# Altium footprint library cool_library.PcbLib: 1182 footprints (part 55 of 75)
Each footprint in its own frame and in the unit in brackets; x right, y up, seen from the top. Pads: shape width x height; smd on the part's side, far side on the other; paste and mask are expansions set on the pad; w line width, h text height; cw(c..) or ccw(c..) is an arc to the next point about the centre after c.
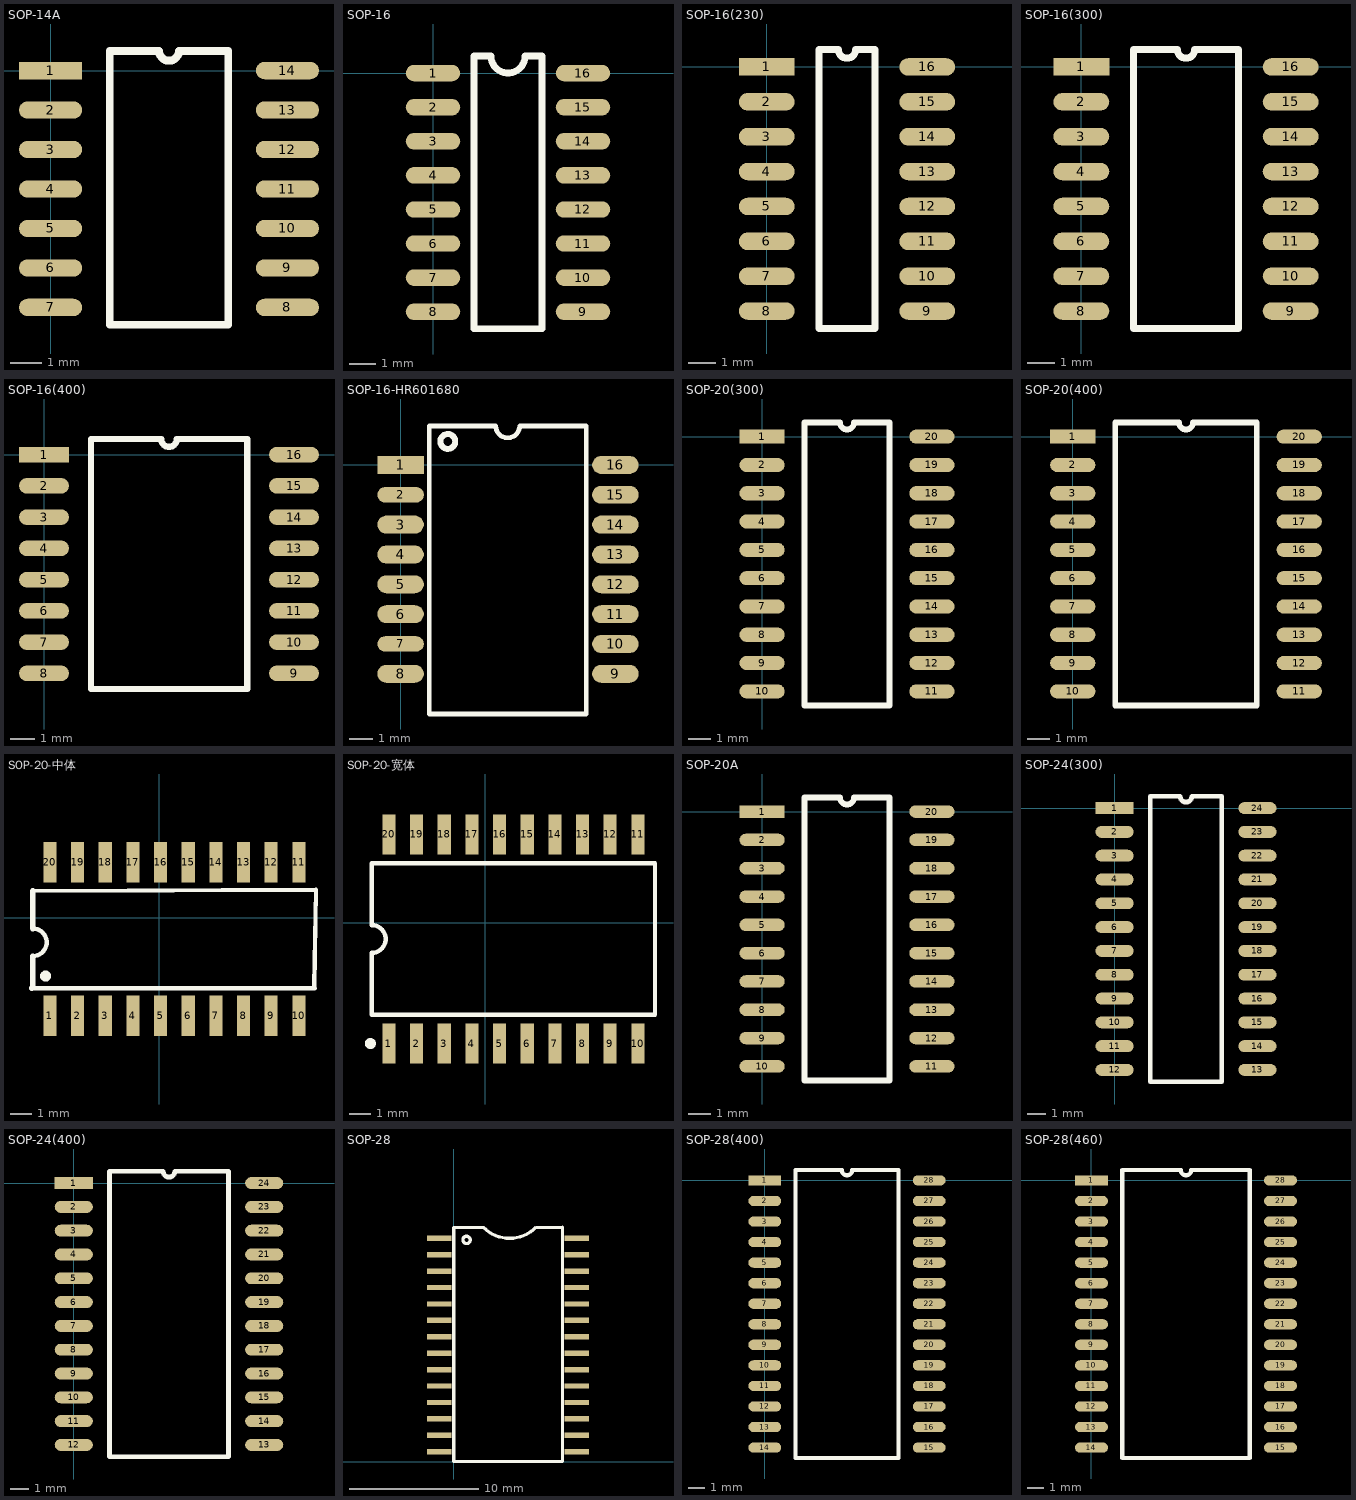
[diagram p54: the footprints below, top view; thin cyan lines are the x and y axes]

## SOP-14A [mil]
pads (14):
  rect 80x22 smd: 1(0,0)
  oval 80x22 smd: 2(0,-50) 3(0,-100) 4(0,-150) 5(0,-200) 6(0,-250) 7(0,-300) 8(300,-300) 9(300,-250) 10(300,-200) 11(300,-150) 12(300,-100) 13(300,-50) 14(300,0)
Top Overlay:
  lines w10: 75,-322 225,-322 225,25 162.5,25 cw(c150,25) 137.5,25 75,25 75,-322

## SOP-16 [mil]
height 48.03
pads (16):
  oval 80x24 smd: 1(0,0) 2(0,-50) 3(0,-100) 4(0,-150) 5(0,-200) 6(0,-250) 7(0,-300) 8(0,-350) 9(220,-350) 10(220,-300) 11(220,-250) 12(220,-200) 13(220,-150) 14(220,-100) 15(220,-50) 16(220,0)
Top Overlay:
  lines w10: 60,-375 160,-375 160,25 135,25 cw(c110,25) 85,25 60,25 60,-375
3D body: height 153.54, standoff 0, extent 44,-380 176,30

## SOP-16(230) [mil]
pads (16):
  rect 80x25 smd: 1(0,0)
  oval 80x25 smd: 2(0,-50) 3(0,-100) 4(0,-150) 5(0,-200) 6(0,-250) 7(0,-300) 8(0,-350) 9(230,-350) 10(230,-300) 11(230,-250) 12(230,-200) 13(230,-150) 14(230,-100) 15(230,-50) 16(230,0)
Top Overlay:
  lines w10: 75,-375 75,25 102.5,25 ccw(c115,25) 127.5,25 155,25 155,-375 75,-375

## SOP-16(300) [mil]
pads (16):
  rect 80x25 smd: 1(0,0)
  oval 80x25 smd: 2(0,-50) 3(0,-100) 4(0,-150) 5(0,-200) 6(0,-250) 7(0,-300) 8(0,-350) 9(300,-350) 10(300,-300) 11(300,-250) 12(300,-200) 13(300,-150) 14(300,-100) 15(300,-50) 16(300,0)
Top Overlay:
  lines w10: 75,-375 225,-375 225,25 162.5,25 cw(c150,25) 137.5,25 75,25 75,-375

## SOP-16(400) [mil]
pads (16):
  rect 80x25 smd: 1(0,0)
  oval 80x25 smd: 2(0,-50) 3(0,-100) 4(0,-150) 5(0,-200) 6(0,-250) 7(0,-300) 8(0,-350) 9(400,-350) 10(400,-300) 11(400,-250) 12(400,-200) 13(400,-150) 14(400,-100) 15(400,-50) 16(400,0)
Top Overlay:
  lines w10: 75,-375 75,25 187.5,25 ccw(c200,25) 212.5,25 325,25 325,-375 75,-375

## SOP-16-HR601680 [mil]
pads (16):
  rect 78x30 smd: 1(0,0)
  oval 78x26 smd: 2(0,-50) 7(0,-300)
  oval 78x30 smd: 3(0,-100) 4(0,-150) 5(0,-200) 6(0,-250) 8(0,-350) 9(360,-350) 10(360,-300) 11(360,-250) 12(360,-200) 13(360,-150) 14(360,-100) 15(360,-50) 16(360,0)
Top Overlay:
  circle w10: c79.1,39.37 r12.49
  lines w7.87: 48,-417.32 48,65.37 159.5,65.37 ccw(c179.5,65.37) 199.5,65.37 310.99,65.37 310.99,-417.32 48,-417.32

## SOP-20(300) [mil]
pads (20):
  rect 80x25 smd: 1(0,0)
  oval 80x25 smd: 2(0,-50) 3(0,-100) 4(0,-150) 5(0,-200) 6(0,-250) 7(0,-300) 8(0,-350) 9(0,-400) 10(0,-450) 11(300,-450) 12(300,-400) 13(300,-350) 14(300,-300) 15(300,-250) 16(300,-200) 17(300,-150) 18(300,-100) 19(300,-50) 20(300,0)
Top Overlay:
  lines w10: 75,-475 225,-475 225,25 162.5,25 cw(c150,25) 137.5,25 75,25 75,-475

## SOP-20(400) [mil]
pads (20):
  rect 80x25 smd: 1(0,0)
  oval 80x25 smd: 2(0,-50) 3(0,-100) 4(0,-150) 5(0,-200) 6(0,-250) 7(0,-300) 8(0,-350) 9(0,-400) 10(0,-450) 11(400,-450) 12(400,-400) 13(400,-350) 14(400,-300) 15(400,-250) 16(400,-200) 17(400,-150) 18(400,-100) 19(400,-50) 20(400,0)
Top Overlay:
  lines w10: 75,-475 325,-475 325,25 212.5,25 cw(c200,25) 187.5,25 75,25 75,-475

## SOP-20-中体 [mm]
pads (20):
  rect 0.6x1.85 smd: 1(-5.029,-4.495) 2(-3.759,-4.495) 3(-2.489,-4.495) 4(-1.219,-4.495) 5(0.051,-4.495) 6(1.321,-4.495) 7(2.591,-4.495) 8(3.861,-4.495) 9(5.131,-4.495) 10(6.401,-4.495) 11(6.401,2.565) 12(5.131,2.565) 13(3.861,2.565) 14(2.591,2.565) 15(1.321,2.565) 16(0.051,2.565) 17(-1.219,2.565) 18(-2.489,2.565) 19(-3.759,2.565) 20(-5.029,2.565)
Top Overlay:
  circle w0.25: c-5.23,-2.667 r0.125
  lines w0.2: -5.867,-3.226 7.133,-3.226 ; -5.817,-1.753 ccw(c-5.817,-1.118) -5.817,-0.483 ; -5.814,1.24 7.186,1.291 7.112,-3.124
  lines w0.254: -5.867,-3.226 -5.817,-3.175 -5.817,-1.753 ; -5.817,-0.483 -5.814,-0.48 -5.814,1.24

## SOP-20-宽体 [mm]
pads (20):
  rect 0.6x1.85 smd: 1(-4.42,-5.537) 2(-3.15,-5.537) 3(-1.88,-5.537) 4(-0.61,-5.537) 5(0.66,-5.537) 6(1.93,-5.537) 7(3.2,-5.537) 8(4.47,-5.537) 9(5.74,-5.537) 10(7.01,-5.537) 11(7.01,4.063) 12(5.74,4.063) 13(4.47,4.063) 14(3.2,4.063) 15(1.93,4.063) 16(0.66,4.063) 17(-0.61,4.063) 18(-1.88,4.063) 19(-3.15,4.063) 20(-4.42,4.063)
Top Overlay:
  circle w0.25: c-5.27,-5.537 r0.125
  lines w0.2: -5.205,-4.212 -5.205,-1.372 ccw(c-5.205,-0.737) -5.205,-0.102 -5.205,2.738 7.795,2.738 7.795,-4.212 -5.205,-4.212

## SOP-20A [mil]
pads (20):
  rect 80x22 smd: 1(0,0)
  oval 80x22 smd: 2(0,-50) 3(0,-100) 4(0,-150) 5(0,-200) 6(0,-250) 7(0,-300) 8(0,-350) 9(0,-400) 10(0,-450) 11(300,-450) 12(300,-400) 13(300,-350) 14(300,-300) 15(300,-250) 16(300,-200) 17(300,-150) 18(300,-100) 19(300,-50) 20(300,0)
Top Overlay:
  lines w10: 75,-475 225,-475 225,25 162.5,25 cw(c150,25) 137.5,25 75,25 75,-475

## SOP-24(300) [mil]
pads (24):
  rect 80x25 smd: 1(0,0)
  oval 80x25 smd: 2(0,-50) 3(0,-100) 4(0,-150) 5(0,-200) 6(0,-250) 7(0,-300) 8(0,-350) 9(0,-400) 10(0,-450) 11(0,-500) 12(0,-550) 13(300,-550) 14(300,-500) 15(300,-450) 16(300,-400) 17(300,-350) 18(300,-300) 19(300,-250) 20(300,-200) 21(300,-150) 22(300,-100) 23(300,-50) 24(300,0)
Top Overlay:
  lines w10: 75,-575 225,-575 225,25 162.5,25 cw(c150,25) 137.5,25 75,25 75,-575

## SOP-24(400) [mil]
pads (24):
  rect 80x25 smd: 1(0,0)
  oval 80x25 smd: 2(0,-50) 3(0,-100) 4(0,-150) 5(0,-200) 6(0,-250) 7(0,-300) 8(0,-350) 9(0,-400) 10(0,-450) 11(0,-500) 12(0,-550) 13(400,-550) 14(400,-500) 15(400,-450) 16(400,-400) 17(400,-350) 18(400,-300) 19(400,-250) 20(400,-200) 21(400,-150) 22(400,-100) 23(400,-50) 24(400,0)
Top Overlay:
  lines w10: 75,-575 325,-575 325,25 212.5,25 cw(c200,25) 187.5,25 75,25 75,-575

## SOP-28 [mm]
pads (28):
  rect 1.9x0.41 smd: 1(-1.143,17.272) 2(-1.143,16.002) 3(-1.143,14.732) 4(-1.143,13.462) 5(-1.143,12.192) 6(-1.143,10.922) 7(-1.143,9.652) 8(-1.143,8.382) 9(-1.143,7.112) 10(-1.143,5.842) 11(-1.143,4.572) 12(-1.143,3.302) 13(-1.143,2.032) 14(-1.143,0.762) 15(9.525,0.762) 16(9.525,2.032) 17(9.525,3.302) 18(9.525,4.572) 19(9.525,5.842) 20(9.525,7.112) 21(9.525,8.382) 22(9.525,9.652) 23(9.525,10.922) 24(9.525,12.192) 25(9.525,13.462) 26(9.525,14.732) 27(9.525,16.002) 28(9.525,17.272)
Top Overlay:
  circle w0.254: c0.986,17.145 r0.284
  lines w0.254: 8.331,18.11 7.493,18.11 6.35,18.11 cw(c4.318,20.142) 2.286,18.11 0,18.11 0,0 8.41,0 8.41,18.133

## SOP-28(400) [mil]
pads (28):
  rect 80x25 smd: 1(0,0)
  oval 80x25 smd: 2(0,-50) 3(0,-100) 4(0,-150) 5(0,-200) 6(0,-250) 7(0,-300) 8(0,-350) 9(0,-400) 10(0,-450) 11(0,-500) 12(0,-550) 13(0,-600) 14(0,-650) 15(400,-650) 16(400,-600) 17(400,-550) 18(400,-500) 19(400,-450) 20(400,-400) 21(400,-350) 22(400,-300) 23(400,-250) 24(400,-200) 25(400,-150) 26(400,-100) 27(400,-50) 28(400,0)
Top Overlay:
  lines w10: 75,-675 75,25 187.5,25 ccw(c200,25) 212.5,25 325,25 325,-675 75,-675

## SOP-28(460) [mil]
pads (28):
  rect 80x25 smd: 1(0,0)
  oval 80x25 smd: 2(0,-50) 3(0,-100) 4(0,-150) 5(0,-200) 6(0,-250) 7(0,-300) 8(0,-350) 9(0,-400) 10(0,-450) 11(0,-500) 12(0,-550) 13(0,-600) 14(0,-650) 15(460,-650) 16(460,-600) 17(460,-550) 18(460,-500) 19(460,-450) 20(460,-400) 21(460,-350) 22(460,-300) 23(460,-250) 24(460,-200) 25(460,-150) 26(460,-100) 27(460,-50) 28(460,0)
Top Overlay:
  lines w10: 75,-675 385,-675 385,25 242.5,25 cw(c230,25) 217.5,25 75,25 75,-675